# Altium footprint library RES_TH.PcbLib: 104 footprints (part 6 of 7)
Each footprint in its own frame and in the unit in brackets; x right, y up, seen from the top. Pads: shape width x height; smd on the part's side, far side on the other; paste and mask are expansions set on the pad; w line width, h text height; cw(c..) or ccw(c..) is an arc to the next point about the centre after c.
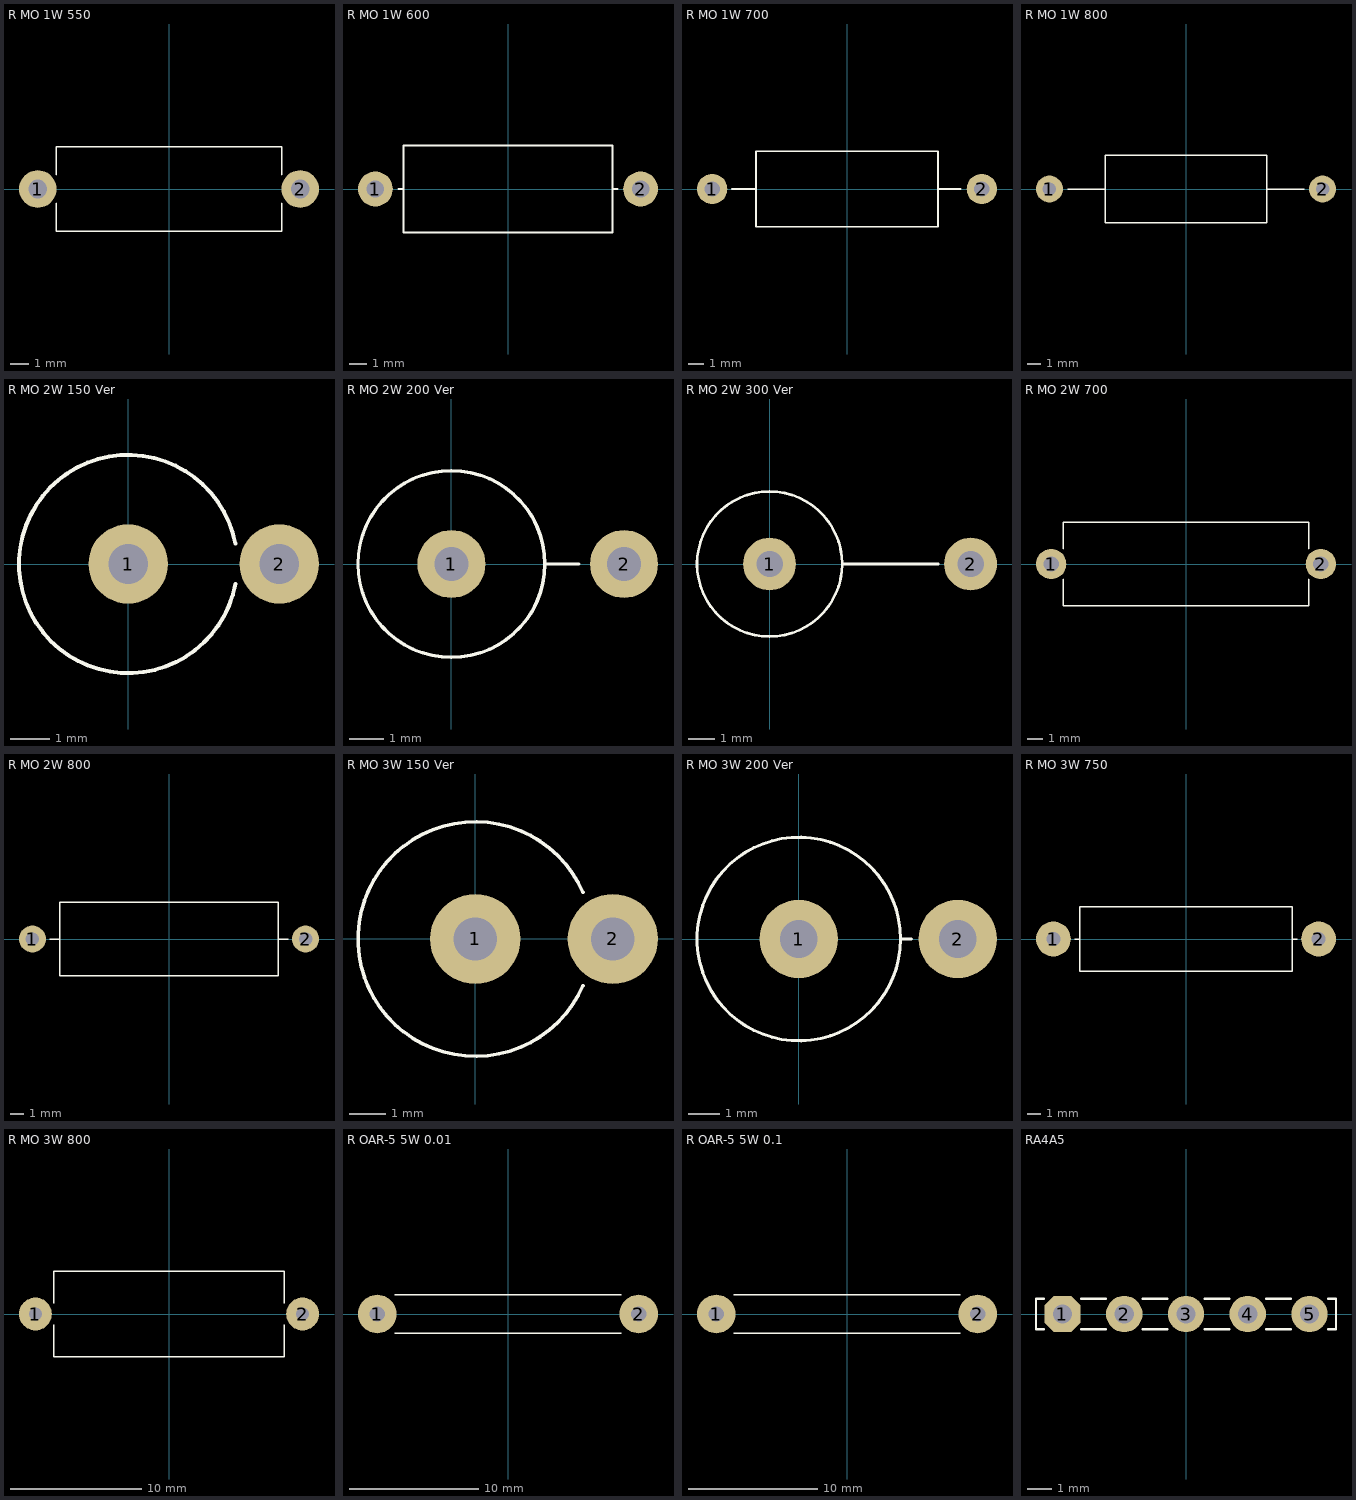
[diagram p5: the footprints below, top view; thin cyan lines are the x and y axes]

## R MO 1W 550 [mm]
pads (2):
  round 2 hole 1: 1(-6.985,0) 2(6.985,0)
Top Overlay:
  lines w0.1: -6,-0.762 -6,-2.25 6,-2.25 6,-0.762 ; -6,0.762 -6,2.25 6,2.25 6,0.762
3D body "R1W MO 550.SLDPRT": height 5, standoff -2.54, extent -7.284,-2.5 7.283,2.5

## R MO 1W 600 [mm]
pads (2):
  round 2 hole 1: 1(-7.62,0) 2(7.62,0)
Top Overlay:
  lines w0.1: -6.3,0 -6,0 ; 6,0 6.313,0 ; -6,-2.5 -6,2.5 6,2.5 6,-2.5 -6,-2.5
3D body "R1W MO 600.SLDPRT": height 5, standoff -2.54, extent -7.918,-2.5 7.918,2.5

## R MO 1W 700 [mm]
pads (2):
  round 2 hole 1: 1(-8.89,0) 2(8.89,0)
Top Overlay:
  lines w0.1: -7.6,0 -6,0 ; 6,0 7.5,0 ; -6,-2.5 -6,2.5 6,2.5 6,-2.5 -6,-2.5
3D body "R1W MO 700.SLDPRT": height 5, standoff -2.54, extent -9.188,-2.5 9.188,2.5

## R MO 1W 800 [mm]
pads (2):
  round 2 hole 1: 1(-10.16,0) 2(10.16,0)
Top Overlay:
  lines w0.1: -8.802,0 -6.002,0 ; 5.998,0 8.798,0 ; -6.002,-2.5 5.998,-2.5 5.998,2.5 -6.002,2.5 -6.002,-2.5
3D body "R1W MO 800.SLDPRT": height 5, standoff -2.54, extent -10.458,-2.5 10.458,2.5

## R MO 2W 150 Ver [mm]
pads (2):
  round 2 hole 1: 1(0,0) 2(3.81,0)
Top Overlay:
  lines w0.1: 2.701,0.519 ccw(c0,0) 2.704,-0.501
3D body "R2W MO 150 Ver.SLDPRT": height 19.2, standoff -2.03, extent -2.75,-2.75 4.108,2.75

## R MO 2W 200 Ver [mm]
pads (2):
  round 2 hole 1: 1(0,0) 2(5.08,0)
Top Overlay:
  circle w0.1: c0,0 r2.75
  lines w0.1: 2.75,0 3.75,0
3D body "R2W MO 200 Ver.SLDPRT": height 19.83, standoff -2.03, extent -2.75,-2.75 5.378,2.75

## R MO 2W 300 Ver [mm]
pads (2):
  round 2 hole 1: 1(0,0) 2(7.62,0)
Top Overlay:
  circle w0.1: c0,0 r2.75
  lines w0.1: 2.75,0 6.4,0
3D body "R2W MO 300 Ver.SLDPRT": height 21.11, standoff -2.03, extent -2.75,-2.75 7.918,2.75

## R MO 2W 700 [mm]
pads (2):
  round 2 hole 1: 1(-8.89,0) 2(8.89,0)
Top Overlay:
  lines w0.1: -8.1,-1 -8.1,-2.75 8.1,-2.75 8.1,-1 ; -8.1,1 -8.1,2.75 8.1,2.75 8.1,1
3D body "R2W MO 700.SLDPRT": height 5.5, standoff -2.54, extent -9.188,-2.75 9.188,2.75

## R MO 2W 800 [mm]
pads (2):
  round 2 hole 1: 1(-10.16,0) 2(10.16,0)
Top Overlay:
  lines w0.1: -8.89,0 -8.125,0 ; 8.125,0 8.89,0 ; -8.125,-2.75 -8.125,2.75 8.125,2.75 8.125,-2.75 -8.125,-2.75
3D body "R2W MO 800.SLDPRT": height 5.5, standoff -2.54, extent -10.458,-2.75 10.458,2.75

## R MO 3W 150 Ver [mm]
pads (2):
  round 2.5 hole 1.2: 1(0,0) 2(3.81,0)
Top Overlay:
  lines w0.1: 2.982,-1.292 cw(c0,0) 2.982,1.292
3D body "R3W MO 150 Ver.SLDPRT": height 20.2, standoff -2.54, extent -3.25,-3.25 4.108,3.25

## R MO 3W 200 Ver [mm]
pads (2):
  round 2.5 hole 1.2: 1(0,0) 2(5.08,0)
Top Overlay:
  circle w0.1: c0,0 r3.25
  lines w0.1: 3.25,0 3.6,0
3D body "R3W MO 200 Ver.SLDPRT": height 20.83, standoff -2.54, extent -3.25,-3.25 5.378,3.25

## R MO 3W 750 [mm]
pads (2):
  round 2.5 hole 1: 1(-9.525,0) 2(9.525,0)
Top Overlay:
  lines w0.1: -8.001,0 -7.62,0 ; 7.62,0 8.001,0 ; -7.62,-2.302 -7.62,2.302 7.62,2.302 7.62,-2.302 -7.62,-2.302
3D body "R3W MO 750.SLDPRT": height 6.5, standoff -2.54, extent -9.823,-3.25 9.823,3.25

## R MO 3W 800 [mm]
pads (2):
  round 2.5 hole 1: 1(-10.16,0) 2(10.16,0)
Top Overlay:
  lines w0.1: -8.75,-0.8 -8.75,-3.25 8.75,-3.25 8.75,-0.8 ; -8.75,0.8 -8.75,3.25 8.75,3.25 8.75,0.8
3D body "R3W MO 800.SLDPRT": height 6.5, standoff -2.54, extent -10.458,-3.25 10.458,3.25

## R OAR-5 5W 0.01 [mm]
pads (2):
  round 3 hole 1.2: 1(-10.16,0) 2(10.16,0)
Top Overlay:
  lines w0.1: -8.8,-1.5 8.8,-1.5 ; -8.8,1.5 8.8,1.5
3D body "R5W OAR5R001FLF.SLDPRT": height 15.21, standoff -3.18, extent -10.86,-1.5 10.86,1.5

## R OAR-5 5W 0.1 [mm]
pads (2):
  round 3 hole 1.2: 1(-10.16,0) 2(10.16,0)
Top Overlay:
  lines w0.1: -8.8,-1.5 8.8,-1.5 ; -8.8,1.5 8.8,1.5
3D body "R5W OAR5R01FLF.SLDPRT": height 15.21, standoff -3.18, extent -10.86,-1.5 10.86,1.5

## RA4A5 [mm]
pads (5):
  oct 1.5x1.5 hole 0.8: 1(-5.08,0)
  round 1.5 hole 0.8: 2(-2.54,0) 3(0,0) 4(2.54,0) 5(5.08,0)
Top Overlay:
  lines w0.1: -5.842,-0.625 -6.17,-0.625 -6.17,0.625 -5.842,0.625 ; -4.318,-0.625 -3.302,-0.625 ; -4.318,0.625 -3.302,0.625 ; -1.778,-0.625 -0.762,-0.625 ; -1.778,0.625 -0.762,0.625 ; 0.762,-0.625 1.778,-0.625 ; 0.762,0.625 1.778,0.625 ; 3.302,-0.625 4.318,-0.625 ; 3.302,0.625 4.318,0.625 ; 5.842,-0.625 6.17,-0.625 6.17,0.625 5.842,0.625
3D body "RM-5.STEP": height 5.3, standoff -3.2, extent -6.17,-0.625 6.13,0.625